# Altium footprint library PcbLib_jp.PcbLib: 255 footprints (part 10 of 16)
Each footprint in its own frame and in the unit in brackets; x right, y up, seen from the top. Pads: shape width x height; smd on the part's side, far side on the other; paste and mask are expansions set on the pad; w line width, h text height; cw(c..) or ccw(c..) is an arc to the next point about the centre after c.
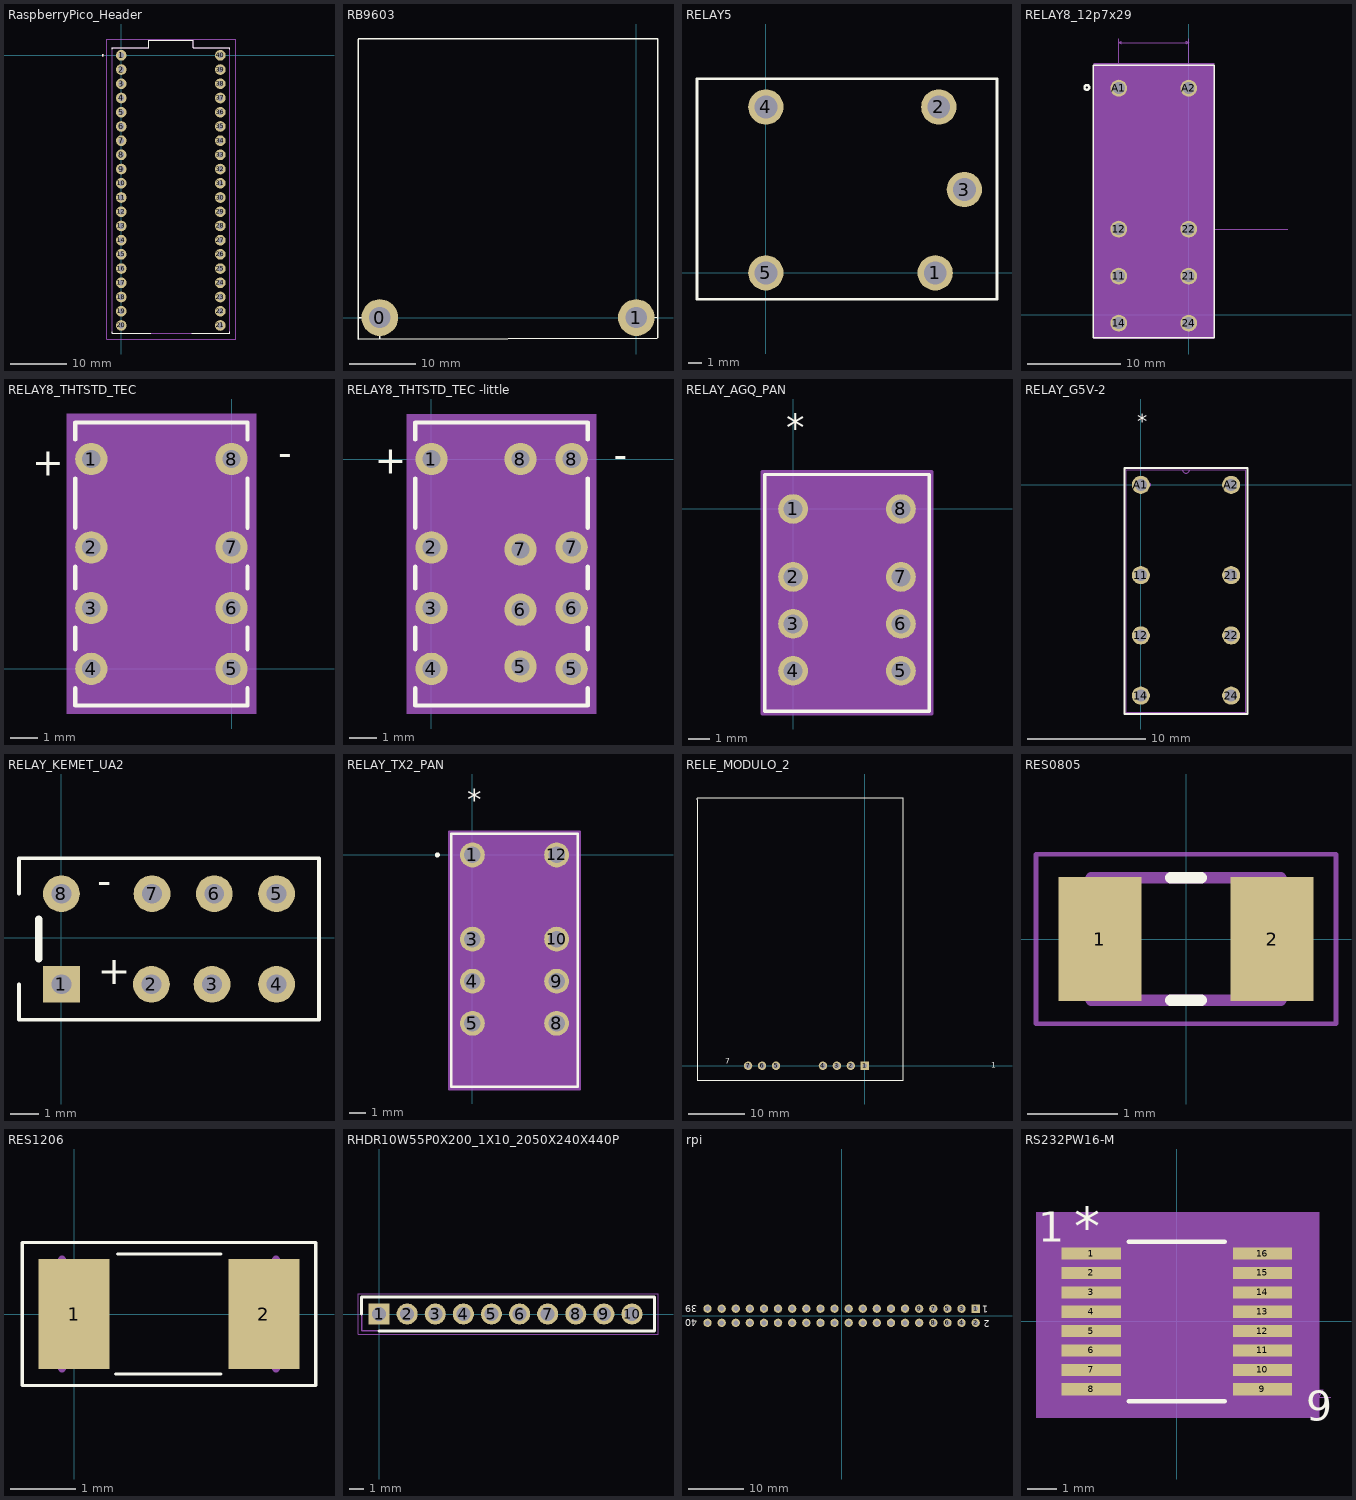
[diagram p9: the footprints below, top view; thin cyan lines are the x and y axes]

## RaspberryPico_Header [mil]
pads (40):
  round 75 hole 40: 1(0,0) 2(0,-100) 3(0,-200) 4(0,-300) 5(0,-400) 6(0,-500) 7(0,-600) 8(0,-700) 9(0,-800) 10(0,-900) 11(0,-1000) 12(0,-1100) 13(0,-1200) 14(0,-1300) 15(0,-1400) 16(0,-1500) 17(0,-1600) 18(0,-1700) 19(0,-1800) 20(0,-1900) 21(697.72,-1900) 22(697.72,-1800) 23(697.72,-1700) 24(697.72,-1600) 25(697.72,-1500) 26(697.72,-1400) 27(697.72,-1300) 28(697.72,-1200) 29(697.72,-1100) 30(697.72,-1000) 31(697.72,-900) 32(697.72,-800) 33(697.72,-700) 34(697.72,-600) 35(697.72,-500) 36(697.72,-400) 37(697.72,-300) 38(697.72,-200) 39(697.72,-100) 40(697.72,0)
Top Layer:
  circle w7.87: c-129,0 r3.94
Top Overlay:
  circle w7.87: c-128.92,0 r3.94
  lines w5: -62.39,-1944.09 -62.39,-1953.94 206.91,-1953.94 ; -62.39,44.09 -62.39,53.94 193.52,53.94 193.52,105.12 508.48,105.12 508.48,53.94 764.39,53.94 764.39,44.09 ; 495.09,-1953.94 764.39,-1953.94 764.39,-1944.09
Mechanical 13:
  circle w7.87: c-128.92,0 r3.94
  lines w5: -62.39,-1953.94 -62.39,53.94 193.52,53.94 193.52,105.12 508.48,105.12 508.48,53.94 764.39,53.94 764.39,-1953.94 -62.39,-1953.94
Mechanical 15:
  lines w1.97: -103.33,-1995.28 805.33,-1995.28 805.33,114.96 -103.33,114.96 -103.33,-1995.28
3D body: height 110.24, standoff 0, extent 277.72,-805 277.72,-805
3D body "PICO_PinsDown.STEP": height 442.13, standoff -59.06, extent -64.05,-1954.53 762.72,104.53

## RB9603 [mil] "Modulo Satelital"
pads (2):
  round 217.48 hole 125.98: 0(-1520,2) 1(-1,2)
Top Overlay:
  lines w7.99: -1648,-125 -1648,1649.65 ; -1648,1652 126.02,1652 126.02,-119 ; -1645,-125 123.65,-122 ; -1645.02,1 -1523,1 ; -1522,-124.02 -1522,1 ; -0.02,0 124,3
3D body "RockBLOCK_9603 v2.step": height 585.72, standoff -83.43, extent -1656.15,-117.84 117.47,2041.6

## RELAY5 [mil]
pads (5):
  round 100 / inner round 60 / far side round 100 hole 65: 1(480,0) 2(490,470) 3(562.47,236) 4(0,470) 5(0,0)
Top Overlay:
  lines w8: -195,-75 655,-75 655,550 -195,550 -195,-75
3D body "20648.stp": height 622.05, standoff -129.92, extent -158.76,-70.02 620.76,552.02

## RELAY8_12p7x29 [mil]
pads (8):
  round 71 hole 51 mask+0: 11(-295.28,163.26) 12(-295.28,361.69) 14(-295.28,-35.17) 21(0,163.26) 22(0,361.69) 24(0,-35.17) A1(-295.28,956.96) A2(0,956.96)
Top Overlay:
  circle w10: c-430,960 r10
  lines w6: -402.64,-97.52 -402.64,1054.48 107.36,1054.48 107.36,-97.52 -402.64,-97.52
Mechanical 5:
  region: 107.09,-102.36 -400.79,-102.36 -400.79,1061.02 107.09,1061.02
Mechanical 7:
  lines w1: -295.28,478.48 -295.28,1164.48 ; 0,478.48 0,1164.48 ; 102.36,361.69 417.36,361.69 ; -295.28,1149.48 -285.28,1144.48 -285.28,1154.48 -295.28,1149.48 ; -295.28,1149.48 0,1149.48 ; 0,1149.48 -10,1144.48 -10,1154.48 0,1149.48
Mechanical 13:
  circle w0: c-360,960 r3
  lines w0: -159.64,1049.48 ccw(c-147.64,1049.48) -135.64,1049.48
  lines w1: -397.64,-92.52 -397.64,1049.48 102.36,1049.48 102.36,-92.52 -397.64,-92.52
Mechanical 15:
  region: 102.36,-92.52 -397.64,-92.52 -397.64,1049.48 102.36,1049.48
  region: 104.36,-94.52 -399.64,-94.52 -399.64,1051.48 104.36,1051.48
  lines w6: -399.64,-94.52 104.36,-94.52 104.36,1051.48 -399.64,1051.48 -399.64,-94.52
3D body: height 10, standoff 0, extent 0,0 10,10
3D body "20557.stp": height 618.11, standoff -137.8, extent -397.99,-101.87 102.01,1039.87

## RELAY8_THTSTD_TEC [mil]
pads (8):
  round 46 hole 26 mask+0: 1(-200,299.51) 2(-200,173.51) 3(-200,86.9) 4(-200,0.28) 5(0,0.28) 6(0,86.9) 7(0,173.51) 8(0,299.51)
Top Overlay:
  lines w6: -223,-27.54 -223,-52.24 23,-52.24 23,-27.54 ; -223,28.11 -223,59.07 ; -223,114.72 -223,145.69 ; -223,201.34 -223,271.69 ; -223,327.34 -223,351.76 23,351.76 23,327.34 ; 23,28.11 23,59.07 ; 23,114.72 23,145.69 ; 23,201.34 23,271.69
  text "-" at 66.54,289.1 h39.37
  text "+" at -284.25,275.98 h39.37
Mechanical 5:
  region: 35,-64.24 -235,-64.24 -235,363.76 35,363.76
Mechanical 13:
  circle w0: c-160,300 r3
  lines w0: -112,346.76 ccw(c-100,346.76) -88,346.76
  lines w1: -218,-47.24 -218,346.76 18,346.76 18,-47.24 -218,-47.24
Mechanical 15:
  region: 18,-47.24 -218,-47.24 -218,346.76 18,346.76
  region: 28,-58 -228,-58 -228,357 28,357
  lines w6: -228,-58 28,-58 28,357 -228,357 -228,-58
3D body: height 10, standoff 0, extent 0,0 10,10
3D body "6-1462037-6.stp": height 183.07, standoff -165.35, extent -217.1,-48.85 19.11,344.85

## RELAY8_THTSTD_TEC -little [mil]
pads (12):
  round 46 hole 26 mask+0: 1(0,0) 2(0,-126) 3(0,-212.61) 4(0,-299.23) 5(200,-299.23) 6(200,-212.61) 7(200,-126) 8(200,0)
  round 46 hole 26: 5(127,-296) 6(127,-215) 7(127,-129) 8(127,0)
Top Overlay:
  lines w6: -23,-327.05 -23,-351.76 223,-351.76 223,-327.05 ; -23,-271.4 -23,-240.44 ; -23,-184.79 -23,-153.82 ; -23,-98.18 -23,-27.82 ; -23,27.82 -23,52.24 223,52.24 223,27.82 ; 223,-271.4 223,-240.44 ; 223,-184.79 223,-153.82 ; 223,-98.18 223,-27.82
  text "+" at -81,-21 h39.37
  text "-" at 260,-13 h39.37
Mechanical 5:
  region: 235,-363.76 -35,-363.76 -35,64.24 235,64.24
Mechanical 13:
  circle w0: c40,0.49 r3
  lines w0: 88,47.24 ccw(c100,47.24) 112,47.24
  lines w1: -18,-346.76 -18,47.24 218,47.24 218,-346.76 -18,-346.76
Mechanical 15:
  region: 218,-346.76 -18,-346.76 -18,47.24 218,47.24
  region: 228,-357.51 -28,-357.51 -28,57.49 228,57.49
  lines w6: -28,-357.51 228,-357.51 228,57.49 -28,57.49 -28,-357.51
3D body: height 10, standoff 0, extent 200,-296.46 210,-289.51
3D body "6-1462037-6.stp": height 183.07, standoff -165.35, extent -15.74,-345.67 220.48,48.03

## RELAY_AGQ_PAN [mil]
pads (8):
  round 55 / inner round 60 / far side round 55 hole 35 paste-27.5 mask+0: 1(0,0) 2(0,-126) 3(0,-213) 4(0,-300) 5(200,-300) 6(200,-213) 7(200,-126) 8(200,0)
Top Overlay:
  lines w6: -52.5,-375 -52.5,64 252.5,64 252.5,-375 -52.5,-375
  text "*" at -12.5,126 h50
Mechanical 13:
  lines w0: 88,59 ccw(c100,59) 112,59
  lines w1: -47.5,-370 -47.5,59 247.5,59 247.5,-370 -47.5,-370
  text "*" at -12.5,8 h50
Mechanical 15:
  region: 247.5,-370 -47.5,-370 -47.5,59 247.5,59
  region: 257.5,-380 -57.5,-380 -57.5,69 257.5,69
  lines w6: -57.5,-380 257.5,-380 257.5,69 -57.5,69 -57.5,-380
3D body "RELAY_AGQ_PAN.step": height 212.99, standoff -20, extent -47.48,-370 247.48,59.02

## RELAY_G5V-2 [mil]
pads (8):
  round 60 hole 40 mask+0: 11(0,-300) 12(0,-500) 14(0,-700) 21(300,-300) 22(300,-500) 24(300,-700) A1(0,0) A2(300,0)
Top Overlay:
  lines w6: -54,-761 354,-761 354,56 -54,56 -54,-761
  text "*" at -12.5,185.33 h50
Mechanical 13:
  circle w0: c30,0 r3
  lines w0: 138,51 ccw(c150,51) 162,51
  lines w1: -49,-756 349,-756 349,51 -49,51 -49,-756
3D body "91b4054_v23105a5001a201.stp": height 393.7, standoff -165.35, extent -49.85,-743.63 343.85,51.65
3D body: height 559.05, standoff 0, extent -6,12 -6,12
3D body: height 10, standoff 0, extent 0,0 10,10

## RELAY_KEMET_UA2 [mm]
pads (8):
  rect 1.3x1.3 / inner round 1.3 / far side rect 1.3x1.3 hole 0.7: 1(0,-1.651)
  round 1.3 hole 0.7: 2(3.18,-1.651) 3(5.32,-1.651) 4(7.6,-1.651) 5(7.6,1.549) 6(5.4,1.549) 7(3.2,1.549) 8(0,1.549)
Top Overlay:
  lines w0.127: -1.5,-1.651 -1.5,-2.901 9.1,-2.901 9.1,2.799 -1.5,2.799 -1.5,1.549
  lines w0.254: -0.8,-0.751 -0.8,0.649
  text "-" at 1.27,1.524 h1.02
  text "+" at 1.278,-1.651 h1.02
3D body "UA2-5SNU.stp": height 8.8, standoff -3.2, extent -1.78,-3.01 9.12,2.99

## RELAY_TX2_PAN [mil]
pads (8):
  round 59 / inner round 60 / far side round 59 hole 39 paste-29.5 mask+0: 1(0,0) 3(0,-200) 4(0,-300) 5(0,-400) 8(200,-400) 9(200,-300) 10(200,-200) 12(200,0)
Top Overlay:
  circle w6: c-83.5,0 r3
  lines w6: -50.5,-551 -50.5,50 250.5,50 250.5,-551 -50.5,-551
  text "*" at -12.5,106.67 h50
Mechanical 13:
  circle w0: c29.5,0 r3
  lines w0: 88,45 ccw(c100,45) 112,45
  lines w1: -45.5,-546 -45.5,45 245.5,45 245.5,-546 -45.5,-546
  text "*" at -12.5,16.67 h50
Mechanical 15:
  region: 245.5,-546 -45.5,-546 -45.5,45 245.5,45
  region: 255.5,-556 -55.5,-556 -55.5,55 255.5,55
  lines w6: -55.5,-556 255.5,-556 255.5,55 -55.5,55 -55.5,-556
3D body "RELAY_TX2_PAN.step": height 322.99, standoff -325.98, extent -45.51,-545.98 245.51,45

## RELE_MODULO_2 [mm] "Connector; Header; 6 Position"
pads (7):
  rect 1.524x1.524 hole 0.762: 1(0,0)
  round 1.5 hole 0.9: 2(-2.508,-0.012) 3(-5.004,-0.012) 4(-7.5,-0.012) 5(-15.9,-0.012) 6(-18.4,-0.012) 7(-20.9,-0.012)
Top Overlay:
  lines w0.2: -30.04,47.906 -30.04,47.64 -30.04,-2.6 6.84,-2.6 6.84,47.946 -30.04,47.946
  text "1" at 22.656,-0.371 h1
  text "7" at -24.994,0.315 h1
3D body "User Library-RelayBoard.STEP": height 17.09, standoff -2.21, extent -30.04,-2.6 6.84,47.946

## RES0805 [mm]
pads (2):
  rect 0.92x1.38 smd: 1(-0.955,0) 2(0.955,0)
Top Overlay:
  lines w0.127: -0.17,-0.68 0.17,-0.68 ; -0.17,0.68 0.17,0.68
Mechanical 13:
  lines w0.127: -1.05,-0.68 1.05,-0.68 1.05,0.68 -1.05,0.68 -1.05,-0.68
Mechanical 15:
  lines w0.05: -1.665,-0.94 1.665,-0.94 1.665,0.94 -1.665,0.94 -1.665,-0.94
3D body "RC0805JR-075K1L.step": height 0.6, standoff 0, extent -1,-0.625 1,0.625

## RES1206 [mm]
pads (2):
  rect 1.08x1.68 smd: 1(0,0) 2(2.89,0)
Top Overlay:
  lines w0.05: 0.635,-0.914 2.235,-0.914 ; 0.66,0.914 2.235,0.914 ; -0.792,-1.09 -0.792,1.09 3.682,1.09 3.682,-1.09 -0.792,-1.09
Mechanical 13:
  lines w0.127: -0.185,-0.83 -0.185,0.83 -0.185,-0.83 ; 3.075,-0.83 3.075,0.83 3.075,-0.83
3D body "User Library-CR3216-1206.STEP": height 0.57, standoff -0.03, extent -0.178,-0.8 3.022,0.8

## RHDR10W55P0X200_1X10_2050X240X440P [mm]
pads (10):
  rect 1.5x1.5 hole 1: 1(0,0)
  round 1.5 hole 1: 2(2,0) 3(4,0) 4(6,0) 5(8,0) 6(10,0) 7(12,0) 8(14,0) 9(16,0) 10(18,0)
Top Overlay:
  lines w0.2: -1.25,0 -1.25,1.2 19.6,1.2 19.6,-1.2 0,-1.2
Mechanical 13:
  lines w0.1: -1.25,-1.2 -1.25,1.2 19.6,1.2 19.6,-1.2 -1.25,-1.2
Mechanical 15:
  lines w0.05: -1.5,-1.45 -1.5,1.45 19.85,1.45 19.85,-1.45 -1.5,-1.45
3D body "NPPN101BFCN-RC.stp": height 4.4, standoff -2.6, extent -1.25,-1.2 19.25,1.2

## rpi [mm]
pads (40):
  rect 1.5x1.5 hole 0.9: 1(24.13,1.27)
  round 1.5 hole 0.9: 2(24.13,-1.27) 3(21.59,1.27) 4(21.59,-1.27) 5(19.05,1.27) 6(19.05,-1.27) 7(16.51,1.27) 8(16.51,-1.27) 9(13.97,1.27) 10(13.97,-1.27) 11(11.43,1.27) 12(11.43,-1.27) 13(8.89,1.27) 14(8.89,-1.27) 15(6.35,1.27) 16(6.35,-1.27) 17(3.81,1.27) 18(3.81,-1.27) 19(1.27,1.27) 20(1.27,-1.27) 21(-1.27,1.27) 22(-1.27,-1.27) 23(-3.81,1.27) 24(-3.81,-1.27) 25(-6.35,1.27) 26(-6.35,-1.27) 27(-8.89,1.27) 28(-8.89,-1.27) 29(-11.43,1.27) 30(-11.43,-1.27) 31(-13.97,1.27) 32(-13.97,-1.27) 33(-16.51,1.27) 34(-16.51,-1.27) 35(-19.05,1.27) 36(-19.05,-1.27) 37(-21.59,1.27) 38(-21.59,-1.27) 39(-24.13,1.27) 40(-24.13,-1.27)
Top Overlay:
  text "2" at 26.7,-0.775 h1.27
  text "1" at 26.4,1.775 h1.27
  text "39" at -26.025,1.9 h1.27
  text "40" at -25.95,-0.65 h1.27
Bottom Overlay:
  lines w0.2: -25.527,-2.54 25.4,-2.54 25.4,2.54 -25.527,2.54 -25.527,-2.54
3D body "female_header_a-bl254-dg-z32d.stp": height 8.5, standoff -3.2, extent -25.525,-2.625 15.365,2.375
3D body "female_header_a-bl254-dg-z32d.stp": height 8.5, standoff -3.2, extent -15.365,-2.627 25.525,2.373

## RS232PW16-M [mil]
pads (16):
  rect 78x16 smd paste+0 mask+0: 1(-113,89.57) 2(-113,63.98) 3(-113,38.39) 4(-113,12.8) 5(-113,-12.8) 6(-113,-38.39) 7(-113,-63.98) 8(-113,-89.57) 9(113,-89.57) 10(113,-63.98) 11(113,-38.39) 12(113,-12.8) 13(113,12.8) 14(113,38.39) 15(113,63.98) 16(113,89.57)
Top Overlay:
  lines w6: -63.58,-105.5 63.58,-105.5 ; -63.58,105.5 63.58,105.5
  text "9" at 171,-131 h39.37
  text "1" at -183,105 h39.37
  text "*" at -135.5,100.57 h50
Mechanical 5:
  region: 188,-127 -186,-127 -186,144 188,144
Mechanical 7:
  lines w1: 0,-100.5 203.5,-100.5 ; 183.5,-90.5 193.5,-90.5 188.5,-100.5 183.5,-90.5
Mechanical 13:
  lines w0: -12,100.5 ccw(c0,100.5) 12,100.5
  lines w1: -130,-95.57 -88.5,-95.57 -88.5,-83.57 -130,-83.57 -130,-95.57 ; -130,-69.98 -88.5,-69.98 -88.5,-57.98 -130,-57.98 -130,-69.98 ; -130,-44.39 -88.5,-44.39 -88.5,-32.39 -130,-32.39 -130,-44.39 ; -130,-18.8 -88.5,-18.8 -88.5,-6.8 -130,-6.8 -130,-18.8 ; -130,6.8 -88.5,6.8 -88.5,18.8 -130,18.8 -130,6.8 ; -130,32.39 -88.5,32.39 -88.5,44.39 -130,44.39 -130,32.39 ; -130,57.98 -88.5,57.98 -88.5,69.98 -130,69.98 -130,57.98 ; -130,83.57 -88.5,83.57 -88.5,95.57 -130,95.57 -130,83.57 ; -88.5,-100.5 -88.5,100.5 88.5,100.5 88.5,-100.5 -88.5,-100.5 ; 88.5,-95.57 130,-95.57 130,-83.57 88.5,-83.57 88.5,-95.57 ; 88.5,-69.98 130,-69.98 130,-57.98 88.5,-57.98 88.5,-69.98 ; 88.5,-44.39 130,-44.39 130,-32.39 88.5,-32.39 88.5,-44.39 ; 88.5,-18.8 130,-18.8 130,-6.8 88.5,-6.8 88.5,-18.8 ; 88.5,6.8 130,6.8 130,18.8 88.5,18.8 88.5,6.8 ; 88.5,32.39 130,32.39 130,44.39 88.5,44.39 88.5,32.39 ; 88.5,57.98 130,57.98 130,69.98 88.5,69.98 88.5,57.98 ; 88.5,83.57 130,83.57 130,95.57 88.5,95.57 88.5,83.57
  text "*" at -86,47.5 h50
3D body "User Library-AS3933-BTST.STEP": height 41.73, standoff -0.2, extent -127.95,-101.39 127.96,99.4
3D body: height 10, standoff 0, extent 0,0 10,10